# Altium integrated library vh_altium_library.intLib: 963 symbols (part 4 of 5) (continued)
## LT1721-SO (continued)

## LT1721-TSOP
designator U?
QUAD COMPARATOR TSOP16; Manufacturer Part Number: LT1721IGN; Manufacturer: Linear Technology; Output Type: CMOS, Rail-to-Rail, TTL; Description: IC COMP R-RINOUT QUAD 16-SSOP; Number of Elements: 4; Voltage - Supply: 2.7 V ~ 6 V; Supplier: Digi-Key; RoHS: RoHS non-compliant; Type: General Purpose; Package / Case: 16-SSOP; Category: Integrated Circuits (ICs); Supplier Part Number: LT1721IGN-ND; Packaging: Tube; Supplier 1: Digi-Key; Supplier Part Number 1: LT1721IGN-ND
footprint TSSOP16
pins: 1 -, 2 +, 3 GND, 4 a, 5 b, 6 GND, 7 +, 8 -, 9 -, 10 +, 11 VCC, 12 C, 13 D, 14 VCC, 15 +, 16 -

## LT1962EMS8-1.5
designator U?, comment LT1962-1V5
LDO 1.5V; Manufacturer Part Number: LT1962EMS8-1.5#PBF; Manufacturer: Linear Technology; Current - Limit (Min): 320mA; Number of Regulators: 1; Regulator Topology: Positive Fixed; Description: IC REG LDO 1.5V 300MA LN 8MSOP; Voltage - Input: 1.8 ~ 20 V; Voltage - Dropout (Typical): 0.27V @ 300mA; Current - Output: 300mA; Supplier 1: Digi-Key; Supplier Part Number 1: LT1962EMS8-1.5#PBF-ND; Supplier Part Number: LT1962EMS8-1.5#PBF-ND; Operating Temperature: -40°C ~ 125°C; Voltage - Output: 1.5V; Supplier: Digi-Key; Category: Integrated Circuits (ICs); RoHS: RoHS Compliant; Packaging: Tube; Package / Case: 8-MSOP, Micro8™, 8-uMAX, 8-uSOP,
footprint MSOP8
pins: 1 OUT, 2 SENSE, 3 BYP, 4 GND, 5 ~{SHDN}, 6 nc, 7 nc, 8 IN

## LT1962EMS8-1.8
designator U?, comment LT1962-1V8
LDO 1.8V; Manufacturer Part Number: LT1962EMS8-1.8; Manufacturer: Linear Technology; Current - Output: 300mA; Current - Limit (Min): 320mA; Voltage - Dropout (Typical): 0.27V @ 300mA; Description: IC REG LDO 1.8V 300MA LN 8MSOP; Number of Regulators: 1; Voltage - Input: Up to 20V; Regulator Topology: Positive Fixed; Supplier 1: Digi-Key; Supplier Part Number 1: LT1962EMS8-1.8-ND; Supplier Part Number: LT1962EMS8-1.8-ND; RoHS: RoHS non-compliant; Packaging: Tube; Category: Integrated Circuits (ICs); Voltage - Output: 1.8V; Package / Case: 8-MSOP, Micro8™, 8-uMAX, 8-uSOP,; Supplier: Digi-Key; Operating Temperature: -40°C ~ 125°C
footprint MSOP8
pins: 1 OUT, 2 SENSE, 3 BYP, 4 GND, 5 ~{SHDN}, 6 nc, 7 nc, 8 IN

## LT1962EMS8-2.5
designator U?, comment LT1962-2V5
LDO 2.5V; Manufacturer: Linear Technology; Manufacturer Part Number: LT1962EMS8-2.5#PBF; Current - Limit (Min): 320mA; Description: IC LDO REG LOWNOISE 2.5V 8-MSOP; Voltage - Input: Up to 20V; Regulator Topology: Positive Fixed; Voltage - Dropout (Typical): 0.27V @ 300mA; Current - Output: 300mA; Number of Regulators: 1; Supplier 1: Digi-Key; Supplier Part Number 1: LT1962EMS8-2.5#PBF-ND; Supplier Part Number: LT1962EMS8-2.5#PBF-ND; Operating Temperature: -40°C ~ 125°C; Package / Case: 8-MSOP, Micro8™, 8-uMAX, 8-uSOP,; Category: Integrated Circuits (ICs); Packaging: Tube; Voltage - Output: 2.5V; RoHS: RoHS Compliant; Supplier: Digi-Key
footprint MSOP8
pins: 1 OUT, 2 SENSE, 3 BYP, 4 GND, 5 ~{SHDN}, 6 nc, 7 nc, 8 IN

## LT1962EMS8-ADJ
designator U?, comment LT1962-ADJ
LDO ADJUSTABLE; Manufacturer Part Number: LT1962EMS8; Manufacturer: Linear Technology; Current - Limit (Min): 320mA; Voltage - Input: 1.8 ~ 20 V; Voltage - Dropout (Typical): 0.27V @ 300mA; Regulator Topology: Positive Adjustable; Number of Regulators: 1; Description: IC LDO REG LOWNOISE ADJ 8-MSOP; Current - Output: 300mA; Voltage - Output: 1.22 ~ 20 V; Supplier Part Number: LT1962EMS8-ND; Operating Temperature: -40°C ~ 125°C; Category: Integrated Circuits (ICs); Package / Case: 8-MSOP, Micro8™, 8-uMAX, 8-uSOP,; Packaging: Tube; RoHS: RoHS non-compliant; Supplier: Digi-Key; Supplier 1: Digi-Key; Supplier Part Number 1: LT1962EMS8-ND
footprint MSOP8
pins: 1 OUT, 2 ADJ, 3 BYP, 4 GND, 5 ~{SHDN}, 6 nc, 7 nc, 8 IN

## LT6100-MSOP
designator U?
CURRENT SENSE AMPLIFIER; Manufacturer Part Number: LT6100HMS8#PBF; Manufacturer: Linear Technology; Description: IC AMP CURRENT SENSE 8MSOP; Current - Supply: 60µA; Number of Circuits: 1; Voltage - Input Offset: 80µV; Slew Rate: 0.05 V/µs; Current - Output / Channel: 15mA; Voltage - Supply, Single/Dual (±): 2.7 V ~ 36 V, ±1.35 V ~ 18 V; NI?: *; O?: *; Section:: *; Supplier 1: Digi-Key; Supplier Part Number 1: LT6100HMS8#PBF-ND; Package / Case: 8-MSOP, Micro8™, 8-uMAX, 8-uSOP,; Supplier Part Number: LT6100HMS8#PBF-ND; Amplifier Type: Current Sense; Category: Integrated Circuits (ICs); Output Type: -; RoHS: RoHS Compliant; Packaging: Tube; Operating Temperature: -40°C ~ 125°C; Gain Bandwidth Product: -; Supplier: Digi-Key; Current - Input Bias: -
footprint MSOP8
pins: 1, 2, 3, 4, 5, 6, 7, 8

## LTC1442
designator U?
DUAL COMPARATOR WITH REFERENCE; Manufacturer Part Number: LTC1442CS8#PBF; Manufacturer: Linear Technology; Number of Elements: 2; Output Type: CMOS, TTL; Voltage - Supply: 2 V ~ 11 V, ±1 V ~ 5.5 V; Description: IC COMP W/REF LP DUAL 8-SOIC; Supplier 1: Digi-Key; Supplier Part Number 1: LTC1442CS8#PBF-ND; Supplier Part Number: LTC1442CS8#PBF-ND; Packaging: Tube; Category: Integrated Circuits (ICs); Type: with Voltage Reference; Supplier: Digi-Key; RoHS: RoHS Compliant; Package / Case: 8-SOIC (3.9mm Width)
footprint SO8
pins: 1, 2, 3, 4, 5, 6, 7, 8
text: V+; +; A; -; HYST; B; REF; V-

## LTC3404
designator U?
SYNCHRONOUS SWITCHER CONTROLLER; Supplier 1: Digi-Key; Supplier Part Number 1: LTC3404EMS8#PBF-ND
footprint MSOP8
pins: 1 RUN, 2 Ith, 3 Vfb, 4 GND, 5 SW, 6 Vin, 7 SYNC/MODE, 8 PLL LPF

## MAX232
designator U?
RS232 LEVEL SHIFTER; Manufacturer Part Number: MAX232DR; Manufacturer: Texas Instruments; Description: IC DUAL EIA-232 DRVR/RCVR 16SOIC; Number of Drivers/Receivers: 2/2; Voltage - Supply: 4.5 V ~ 5.5 V; Supplier 1: Digi-Key; Supplier Part Number 1: 296-14619-1-ND; RoHS: RoHS Compliant; Packaging: Cut Tape (CT); Protocol: RS232; Type: Transceiver; Supplier Part Number: 296-14619-1-ND; Supplier: Digi-Key; Category: Integrated Circuits (ICs); Package / Case: 16-SOIC (3.9mm Width)
footprint SO16
pins: 1 C1+, 2 V+, 3 C1-, 4 C2+, 5 C2-, 6 V-, 7 T2OUT, 8 R2IN, 9 R2OUT, 10 T2IN, 11 T1IN, 12 R1OUT, 13 R1IN, 14 T1OUT, 15 GND hidden to GND, 16 VCC hidden to VCC

## MAX708R
designator U?
RESET GENERATOR WITH POWER FAIL DETECTOR; Manufacturer: Maxim Integrated Products; Manufacturer Part Number: MAX708RCSA+; Output: Push-Pull, Push-Pull; Number of Voltages Monitored: 1; Reset: Active High/Active Low; Voltage - Threshold: 2.63V; Reset Timeout: 140 ms Minimum; Description: IC SUPERVISOR MPU 8-SOIC; Supplier 1: Digi-Key; Supplier Part Number 1: MAX708RCSA+-ND; Package / Case: 8-SOIC (3.9mm Width); Operating Temperature: 0°C ~ 70°C; RoHS: RoHS Compliant; Supplier Part Number: MAX708RCSA+-ND; Category: Integrated Circuits (ICs); Type: Simple Reset/Power-On Reset; Supplier: Digi-Key; Packaging: Tube
footprint SO8
pins: 1 ~{MR}, 2 VCC, 3 GND, 4 PFI, 5 ~{PFO}, 7 ~{RST}, 8 RST

## MAX1236
designator U?
4 CHANNEL 12 BIT A/D; Manufacturer: Maxim Integrated Products; Manufacturer Part Number: MAX1236LEUA+T; Voltage Supply Source: Single Supply; Sampling Rate (Per Second): 94.4k; Number of Bits: 12; Description: IC ADC 12BIT 4CH 2WIRE SER 8UMAX; Number of Converters: 1; Number of Inputs and Type: 4 Single-Ended, Unipolar; 4 Single-Ended, Bipolar; 2 Differential, Unipolar; 2 Differential, Bipolar; Power Dissipation (Max): 3.35mW; Data Interface: Serial; Supplier 1: Digi-Key; Supplier Part Number 1: MAX1236LEUA+T-ND; Supplier Part Number: MAX1236LEUA+T-ND; Operating Temperature: -40°C ~ 85°C; RoHS: RoHS Compliant; Package / Case: 8-MSOP, Micro8™, 8-uMAX, 8-uSOP,; Category: Integrated Circuits (ICs); Supplier: Digi-Key; Packaging: Tape & Reel (TR)
pins: 1 IN1, 2 IN2, 3 IN3, 4 IN4, 5 SCL, 6 SDA, 7 AGND, 8 VDD, 11 AS, 12 ~{CON}, 13 BUSY

## MAX1238
designator U?
12 CHANNEL 12 BIT A/D CONVERTOR; Manufacturer: Maxim Integrated Products; Manufacturer Part Number: MAX1238EEE+; Number of Inputs and Type: 12 Single-Ended, Unipolar; 12 Single-Ended, Bipolar; 6 Differential, Unipolar; 6 Differential, Bipolar; Number of Converters: 1; Description: IC ADC 12-BIT 94KSPS 16-QSOP; Data Interface: Serial; Power Dissipation (Max): 3.35mW; Voltage Supply Source: Single Supply; Sampling Rate (Per Second): 94.4k; Number of Bits: 12; Supplier 1: Digi-Key; Supplier Part Number 1: MAX1238EEE+-ND; Packaging: Tube; Supplier: Digi-Key; Supplier Part Number: MAX1238EEE+-ND; RoHS: RoHS Compliant; Category: Integrated Circuits (ICs); Package / Case: 16-QSOP; Operating Temperature: -40°C ~ 85°C
footprint tssop16
pins: 1 IN1, 2 IN2, 3 IN3, 4 IN4, 5 IN5, 6 IN6, 7 IN7, 8 IN8, 9 SCL, 10 SDA, 11 GND, 12 VDD, 13 IN12, 14 IN11, 15 IN10, 16 IN9

## MAX3370
designator U?
BIDIRECTIONAL LEVEL SHIFTER; Manufacturer Part Number: MAX3370EXK-T; Manufacturer: Maxim Integrated Products; Output Type: Logic; Data Rate: 2Mbps; Supply Voltage: 2.5 V ~ 5.5 V; Number of Channels: 1; Description: IC LEV XLTR LV 2MBPS 1UA SC70-5; Supplier 1: Digi-Key; Supplier Part Number 1: MAX3370EXK-T-ND; Supplier Part Number: MAX3370EXK-T-ND; Package / Case: SC-70-5, SC-88A, SOT-323-5, SOT-353, 5-TSSOP; Category: Integrated Circuits (ICs); Operating Temperature: -40°C ~ 85°C; Supplier: Digi-Key; Input Type: Logic; RoHS: RoHS non-compliant; Packaging: Tape & Reel (TR)
footprint SC70-5
pins: 1 VA, 2, 3, 4, 5 VB

## MAX3371
designator U?
BIDIRECTIONAL LEVEL SHIFTER; Manufacturer: Maxim Integrated Products; Manufacturer Part Number: MAX3371EXT+T; Description: IC LEVEL TRANSLATOR 2MBPS SC70-6; Output Type: Logic; Number of Channels: 1; Data Rate: 2Mbps; Supply Voltage: 2.5 V ~ 5.5 V; Supplier 1: Digi-Key; Supplier Part Number 1: MAX3371EXT+TTR-ND; Supplier Part Number: MAX3371EXT+TTR-ND; Category: Integrated Circuits (ICs); Package / Case: SC-70-6, SC-88, SOT-323-6, SOT-363; Supplier: Digi-Key; Operating Temperature: -40°C ~ 85°C; Packaging: Tape & Reel (TR); Input Type: Logic; RoHS: RoHS Compliant
footprint SC70-6
pins: 1 VA, 2, 3, 4, 5, 6 VB

## MAX4213
designator U?
Supplier 1: Digi-Key; Supplier Part Number 1: MAX4213ESA+-ND
footprint SO8
pins: 2 -, 3 +, 4, 6, 7, 8

## MAX4461
designator U?
INSTRUMENTATION AMPLIFIER; Manufacturer Part Number: MAX4461TESA+; Manufacturer: Maxim Integrated Products; Text Field1: ST; Text Field2: LM2903DT; Text Field3: Avnet; Text Field5: SO8; Text Field6: 0.078; Current - Supply: 800µA; Description: IC INSTR AMP SGL R-R 8-SOIC; Output Type: Rail-to-Rail; Gain Bandwidth Product: 2.5MHz; Voltage - Supply, Single/Dual (±): 2.85 V ~ 5.25 V; Current - Output / Channel: 150mA; Slew Rate: 0.5 V/µs; Current - Input Bias: 1pA; Voltage - Input Offset: 50µV; Number of Circuits: 1; Text Field4: LM2903DT; NI?: *; O?: *; Section:: *; Supplier 1: Digi-Key; Supplier Part Number 1: MAX4461TESA+-ND; Supplier: Digi-Key; Operating Temperature: -40°C ~ 85°C; Packaging: Tube; Amplifier Type: Instrumentation; Category: Integrated Circuits (ICs); Package / Case: 8-SOIC (3.9mm Width); Supplier Part Number: MAX4461TESA+-ND; RoHS: RoHS Compliant
footprint SO8
pins: 1, 2 GND, 3, 6, 7 +, 8 SHDN

## MAX6675
designator *
THERMOCOUPLE INTERFACE
pins: 1 GND, 2 T-, 3 T+, 4 VCC, 5  SCK, 6 ~{CS}, 7 SO

## MAX31855
designator U?
Supplier 1: Mouser; Supplier Part Number 1: 700-MAX31855KASA+
footprint SO8
pins: 1 GND, 2 T-, 3 T+, 4 VCC, 5  SCK, 6 ~{CS}, 7 SO

## MCP3001
designator U?
10 BIT A/D CONVERTOR; Manufacturer: Microchip Technology; Manufacturer Part Number: MCP3001-I/SN; Description: IC ADC 10BIT 2.7V 1CH SPI 8-SOIC; Number of Bits: 10; Sampling Rate (Per Second): 200k; Data Interface: Serial, SPI™; Number of Converters: 1; Voltage Supply Source: Single Supply; Number of Inputs and Type: 1 Pseudo-Differential, Unipolar; Supplier 1: Digi-Key; Supplier Part Number 1: MCP3001-I/SN-ND; Category: Integrated Circuits (ICs); Supplier Part Number: MCP3001-I/SN-ND; Supplier: Digi-Key; RoHS: RoHS Compliant; Power Dissipation (Max): -; Operating Temperature: -40°C ~ 85°C; Mounting Type: Surface Mount; Package / Case: 8-SOIC (3.9mm Width); Packaging: Tube; Supplier Device Package: *
footprint SO8
pins: 1 VREF, 2, 3, 4 VSS, 5 ~{CS}, 6 DO, 7 CLK, 8 VCC

## MCP3201
designator U?
12 BIT A/D CONVERTOR; Manufacturer Part Number: MCP3201-CI/SN; Manufacturer: Microchip Technology; Data Interface: Serial, SPI™; Number of Inputs and Type: 1 Single-Ended, Unipolar; Sampling Rate (Per Second): 100k; Number of Converters: 1; Number of Bits: 12; Voltage Supply Source: Single Supply; Description: IC ADC 12BIT SINGLE CHAN 8SOIC; Supplier 1: Digi-Key; Supplier Part Number 1: MCP3201-CI/SN-ND; RoHS: RoHS Compliant; Power Dissipation (Max): -; Mounting Type: Surface Mount; Supplier: Digi-Key; Operating Temperature: -40°C ~ 85°C; Category: Integrated Circuits (ICs); Supplier Part Number: MCP3201-CI/SN-ND; Supplier Device Package: *; Packaging: Tube; Package / Case: 8-SOIC (3.9mm Width)
footprint SO8
pins: 1 VREF, 2, 3, 4 VSS, 5 ~{CS}, 6 DO, 7 CLK, 8 VCC

## MCP3301
designator U?
13 BIT A/D CONVERTOR; Manufacturer Part Number: MCP3301-BI/SN; Manufacturer: Microchip Technology; Voltage Supply Source: Single Supply; Description: IC ADC 13BIT 2.7V SPI 8-SOIC; Number of Converters: 1; Data Interface: Serial, SPI™; Number of Bits: 13; Sampling Rate (Per Second): 100k; Supplier 1: Digi-Key; Supplier Part Number 1: MCP3301-BI/SN-ND; Supplier Part Number: MCP3301-BI/SN-ND; Supplier: Digi-Key; Number of Inputs and Type: *; Category: Integrated Circuits (ICs); Mounting Type: Surface Mount; Supplier Device Package: *; Packaging: Tube; RoHS: RoHS Compliant; Package / Case: 8-SOIC (3.9mm Width); Power Dissipation (Max): -; Operating Temperature: -40°C ~ 85°C
footprint SO8
pins: 1 VREF, 2, 3, 4 VSS, 5 ~{CS}, 6 DO, 7 CLK, 8 VCC

## MCP3550
designator U?
22 BIT A/D CONVERTOR; Manufacturer: Microchip Technology; Manufacturer Part Number: MCP3550-60E/SN; Voltage Supply Source: Single Supply; Number of Bits: 22; Sampling Rate (Per Second): 15; Number of Converters: 1; Data Interface: Serial, SPI™; Number of Inputs and Type: 1 Differential, Unipolar; Description: IC ADC 22BIT 2.7V 1CH 8SOIC; Supplier 1: Digi-Key; Supplier Part Number 1: MCP3550-60E/SN-ND; Power Dissipation (Max): -; Supplier Part Number: MCP3550-60E/SN-ND; Packaging: Tube; Supplier Device Package: *; Supplier: Digi-Key; Operating Temperature: -40°C ~ 125°C; Package / Case: 8-SOIC (3.9mm Width); Mounting Type: Surface Mount; RoHS: RoHS Compliant
footprint SO8
pins: 1 VREF, 2, 3, 4 VSS, 5 CLK, 6 DO, 7 ~{CS}, 8 VCC

## NE555
designator U?
TIMER IC; Manufacturer Part Number: NE555DT; Manufacturer: STMicroelectronics; Frequency: 500kHz; Voltage - Supply: 4.5 V ~ 16 V; Current: 200mA; Description: IC TIMER SINGLE BIPOLAR 8 SOIC; Supplier 1: Digi-Key; Supplier Part Number 1: 497-1962-2-ND; Supplier: Digi-Key; Category: Integrated Circuits (ICs); Supplier Part Number: 497-1962-2-ND; Package / Case: 8-SOIC (3.9mm Width); Packaging: Tape & Reel (TR); RoHS: RoHS Compliant; Operating Temperature: 0°C ~ 70°C; Count: -; Type: 555 Type, Timer/Oscillator (Single)
footprint SO8
pins: 1 GND, 2 TRIG, 3 OUT, 4 RST, 5 C, 6 TH, 7 DIS, 8 VCC

## OP2177
designator U?
PRECISION OPAMP 1.3 MHz; Manufacturer: Analog Devices Inc; Manufacturer Part Number: OP2177ARZ-REEL; Slew Rate: 0.7 V/µs; Description: IC OPAMP GP 1.3MHZ DUAL LN 8SOIC; Current - Supply: 400µA; Amplifier Type: General Purpose; Number of Circuits: 2; Current - Input Bias: 500pA; Voltage - Input Offset: 15µV; Gain Bandwidth Product: 1.3MHz; Current - Output / Channel: 10mA; Voltage - Supply, Single/Dual (±): 5 V ~ 36 V, ±2.5 V ~ 18 V; Supplier 1: Digi-Key; Supplier Part Number 1: OP2177ARZ-REEL-ND; Supplier: Digi-Key; RoHS: RoHS Compliant; Packaging: Tape & Reel (TR); Category: Integrated Circuits (ICs); Operating Temperature: -40°C ~ 125°C; Package / Case: 8-SOIC (3.9mm Width); Output Type: -; Supplier Part Number: OP2177ARZ-REEL-ND
footprint so8
part A pins: 5 (in), 6 (in), 7 OUT (out), 8 (power)
part B pins: 1 1 OUT (out), 2 1 IN- (in), 3 1 IN+ (in), 4 (power)

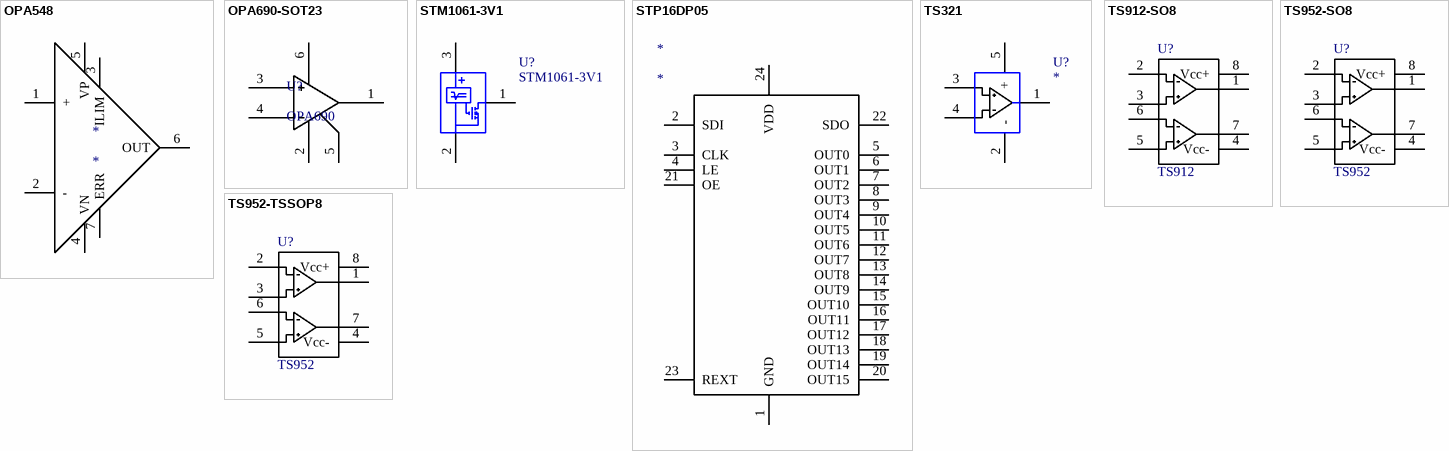
[diagram p43: symbols OPA548 to TS952-TSSOP8]

## OPA548
designator *
pins: 1 +, 2 -, 3 ILIM, 4 VN, 5 VP, 6 OUT, 7 ERR

## OPA690-SOT23
designator U?, comment OPA690
Supplier 1: Digi-Key; Supplier Part Number 1: OPA690IDBVRG4-ND
footprint SOT23-6
pins: 1, 2, 3 -, 4 +, 5, 6

## STM1061-3V1
designator U?
VOLTAGE DETECTOR 3.1V; Manufacturer: STMicroelectronics; Manufacturer Part Number: STM1061N31WX6F; Reset Timeout: 30 µs Typical Propagation Delay; Number of Voltages Monitored: 1; Output: Open Drain or Open Collector; Reset: Active Low; Description: IC VOLT DETECTOR 3.1V LP SOT-23; Supplier 1: Digi-Key; Supplier Part Number 1: 497-4957-1-ND; Voltage - Threshold: 3.1V; RoHS: RoHS Compliant; Supplier Part Number: 497-4957-1-ND; Operating Temperature: -40°C ~ 85°C; Type: Simple Reset/Power-On Reset; Category: Integrated Circuits (ICs); Packaging: Cut Tape (CT); Package / Case: SOT-23-3; Supplier: Digi-Key
footprint sot23-123
pins: 1 OUT, 2 GND, 3 VCC

## STP16DP05
designator *
pins: 1 GND, 2 SDI, 3 CLK, 4 LE, 5 OUT0, 6 OUT1, 7 OUT2, 8 OUT3, 9 OUT4, 10 OUT5, 11 OUT6, 12 OUT7, 13 OUT8, 14 OUT9, 15 OUT10, 16 OUT11, 17 OUT12, 18 OUT13, 19 OUT14, 20 OUT15, 21 OE, 22 SDO, 23 REXT, 24 VDD

## TS321
designator U?
LOW POWER OPAMP SOT23; Manufacturer Part Number: TS321ILT; Manufacturer: STMicroelectronics; Description: IC OPAMP SGL BIPOLAR LP SOT23-5; Gain Bandwidth Product: 800kHz; Current - Supply: 600µA; Current - Output / Channel: 40mA; Number of Circuits: 1; Current - Input Bias: 20nA; Voltage - Supply, Single/Dual (±): 3 V ~ 30 V, ±1.5 V ~ 15 V; Voltage - Input Offset: 500µV; Amplifier Type: General Purpose; Slew Rate: 0.4 V/µs; Supplier 1: Digi-Key; Supplier Part Number 1: 497-4061-1-ND; Operating Temperature: -40°C ~ 125°C; RoHS: RoHS Compliant; Category: Integrated Circuits (ICs); Package / Case: SOT-23-5, SC-74A, SOT-25; Supplier Part Number: 497-4061-1-ND; Packaging: Cut Tape (CT); Supplier: Digi-Key; Output Type: -
footprint SOT23-5
pins: 1, 2 -, 3, 4, 5 +

## TS912-SO8
designator U?, comment TS912
DUAL RAIL TO RAIL OPAMP; Manufacturer Part Number: TS921ID; Manufacturer: STMicroelectronics; Number of Circuits: 1; Slew Rate: 1.3 V/µs; Current - Output / Channel: 80mA; Voltage - Supply, Single/Dual (±): 2.7 V ~ 12 V; Output Type: Rail-to-Rail; Current - Input Bias: 15nA; Gain Bandwidth Product: 4MHz; Amplifier Type: General Purpose; Voltage - Input Offset: 3000µV; Description: IC OP AMP R-R SINGLE 8-SOIC; Current - Supply: 1mA; NI?: *; O?: *; Section:: *; Supplier 1: Digi-Key; Supplier Part Number 1: TS921ID-ND; Category: Integrated Circuits (ICs); Supplier Part Number: TS921ID-ND; Packaging: Tube; RoHS: RoHS Compliant; Operating Temperature: -40°C ~ 125°C; Supplier: Digi-Key; Package / Case: 8-SOIC (3.9mm Width)
footprint SO8
pins: 1, 2, 3, 4 Vcc-, 5, 6, 7, 8 Vcc+

## TS952-SO8
designator U?, comment TS952
DUAL RAIL TO RAIL OPAMP; Manufacturer Part Number: TS952IYDT; Manufacturer: STMicroelectronics; Gain Bandwidth Product: 3MHz; Current - Supply: 950µA; Output Type: Rail-to-Rail; Description: IC OP AMP RRIO LOW PWR 8-SOIC; Current - Input Bias: 35nA; Amplifier Type: General Purpose; Voltage - Supply, Single/Dual (±): 2.7 V ~ 12 V; Slew Rate: 1 V/µs; Voltage - Input Offset: 6000µV; Current - Output / Channel: 10mA; Number of Circuits: 2; NI?: *; O?: *; Section:: *; Supplier 1: Digi-Key; Supplier Part Number 1: 497-4777-6-ND; Operating Temperature: -40°C ~ 125°C; Package / Case: 8-SOIC (3.9mm Width); Supplier: Digi-Key; Category: Integrated Circuits (ICs); Packaging: Digi-Reel®; Supplier Part Number: 497-4777-6-ND; RoHS: RoHS Compliant
footprint SO8
pins: 1, 2, 3, 4 Vcc-, 5, 6, 7, 8 Vcc+

## TS952-TSSOP8
designator U?, comment TS952
DUAL RAIL TO RAIL OPAMP; Manufacturer Part Number: TS952IYPT; Manufacturer: STMicroelectronics; Description: IC OP AMP RRIO LOW PWR 8-TSSOP; Supplier 1: Digi-Key; Supplier Part Number 1: 497-10266-2-ND
footprint TSSOP8
pins: 1, 2, 3, 4 Vcc-, 5, 6, 7, 8 Vcc+


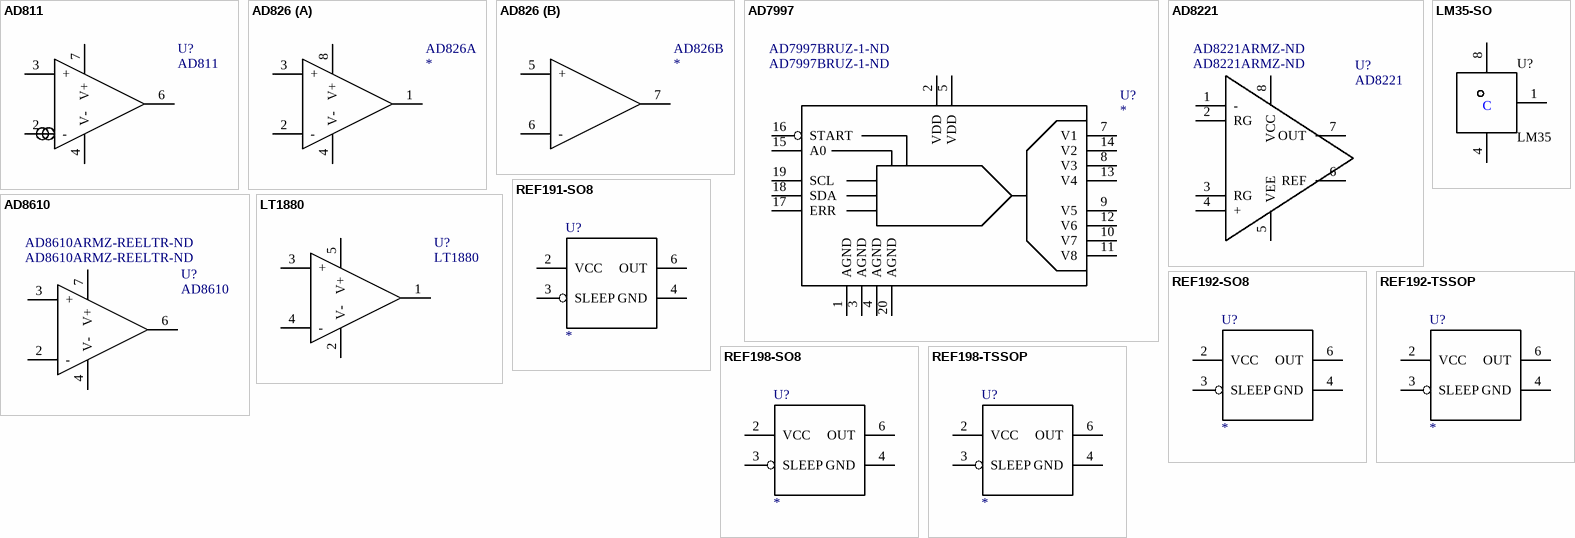
[diagram p44: symbols AD811 to REF198-TSSOP]

## AD811
designator U?
footprint SO8
pins: 2 -, 3 +, 4 V-, 6 OUT, 7 V+

## AD826
designator AD826
AD826; Manufacturer: Analog Devices Inc; Manufacturer Part Number: AD826ARZ; Current - Input Bias: 3.3µA; Current - Output / Channel: 50mA; Slew Rate: 350 V/µs; Number of Circuits: 2; Description: IC OPAMP VF 50MHZ DUAL LP 8SOIC; Current - Supply: 6.6mA; Voltage - Supply, Single/Dual (±): 5 V ~ 36 V, ±2.5 V ~ 18 V; Voltage - Input Offset: 500µV; Gain Bandwidth Product: 50MHz; Amplifier Type: Voltage Feedback; Supplier 1: Digi-Key; Supplier: Digi-Key; Package / Case: 8-SOIC (3.9mm Width); Operating Temperature: -40°C ~ 85°C; Category: Integrated Circuits (ICs); Packaging: Tube; RoHS: RoHS Compliant; Output Type: -; Supplier Part Number 1: AD826ARZ-ND; Supplier Part Number: AD826ARZ-ND
footprint SO8
part A pins: 1 OUT, 2 -, 3 +, 4 V-, 8 V+
part B pins: 5 +, 6 -, 7 OUT

## AD7997
designator U?  Supplier Part Number 1: AD7997BRUZ-1-ND
AD7997; Manufacturer Part Number: AD7997BRUZ-1; Manufacturer: Analog Devices Inc; Number of Bits: 10; Data Interface: I²C; Power Dissipation (Max): 2.2mW; Voltage Supply Source: Single Supply; Sampling Rate (Per Second): 188k; Number of Converters: 1; Description: IC ADC 10BIT 8CHAN I2C 20TSSOP; Number of Inputs and Type: 8 Single-Ended, Unipolar; Supplier 1: Digi-Key; Package / Case: 20-TSSOP; RoHS: RoHS Compliant; Packaging: Tube; Operating Temperature: -40°C ~ 85°C; Category: Integrated Circuits (ICs); Supplier: Digi-Key; Supplier Part Number: AD7997BRUZ-1-ND
pins: 1 AGND, 2 VDD, 3 AGND, 4 AGND, 5 VDD, 7  V1, 8 V3, 9 V5, 10 V7, 11 V8, 12 V6, 13 V4, 14 V2, 15 A0, 16 START, 17 ERR, 18 SDA, 19 SCL, 20 AGND

## AD8221
designator U?  Supplier Part Number 1: AD8221ARMZ-ND
Manufacturer: Analog Devices Inc; Manufacturer Part Number: AD8221ARMZ; Number of Circuits: 1; Current - Output / Channel: 18mA; Description: IC AMP INST PREC LN 18MA 8MSOP; Voltage - Supply, Single/Dual (±): ±2.3 V ~ 18 V; Slew Rate: 2 V/µs; Current - Input Bias: 500pA; Amplifier Type: Instrumentation; Voltage - Input Offset: 60µV; Current - Supply: 900µA; Supplier 1: Digi-Key; Packaging: Tube; Package / Case: 8-MSOP, Micro8™, 8-uMAX, 8-uSOP,; Supplier: Digi-Key; Category: Integrated Circuits (ICs); Output Type: -; Operating Temperature: -40°C ~ 85°C; Gain Bandwidth Product: -; RoHS: RoHS Compliant; Supplier Part Number: AD8221ARMZ-ND
footprint MSOP8
pins: 1 -, 2 RG, 3 RG, 4 +, 5 VEE, 6 REF, 7 OUT, 8 VCC

## AD8610
designator U?  Supplier Part Number 1: AD8610ARMZ-REELTR-ND
Manufacturer: Analog Devices Inc; Manufacturer Part Number: AD8610ARMZ-REEL; Description: IC OPAMP JFET 25MHZ PREC 8MSOP; Slew Rate: 60 V/µs; Number of Circuits: 1; Voltage - Input Offset: 85µV; Current - Output / Channel: 45mA; Current - Supply: 3mA; Voltage - Supply, Single/Dual (±): ±5 V ~ 13 V; Amplifier Type: J-FET; Gain Bandwidth Product: 25MHz; Current - Input Bias: 3pA; Supplier 1: Digi-Key; Category: Integrated Circuits (ICs); Operating Temperature: -40°C ~ 125°C; Packaging: Tape & Reel (TR); Package / Case: 8-MSOP, Micro8™, 8-uMAX, 8-uSOP,; RoHS: RoHS Compliant; Supplier: Digi-Key; Output Type: -; Supplier Part Number: AD8610ARMZ-REELTR-ND
footprint MSOP8
pins: 2 -, 3 +, 4 V-, 6 OUT, 7 V+

## LM35-SO
designator U?, comment LM35
LM35 TEMPERATURE SENSOR; Part Field 1: Centigrade Temperature Sensor LM35 SO8; Part Field 2: Digikey; Part Field 3: LM35DM-ND; Part Field 4: NATIONAL SEMICONDUCTOR
footprint SO8
pins: 1 OUT, 4 GND, 8 V+
text: C

## LT1880
designator U?
Manufacturer: Linear Technology; Manufacturer Part Number: LT1880CS5#TRMPBF; Current - Output / Channel: 25mA; Slew Rate: 0.55 V/µs; Current - Input Bias: 150pA; Number of Circuits: 1; Voltage - Supply, Single/Dual (±): 2.7 V ~ 36 V, ±1.35 V ~ 18 V; Voltage - Input Offset: 40µV; Amplifier Type: General Purpose; Description: IC OPAMP PICO/IN RR/OUT TSOT23-5; Gain Bandwidth Product: 1.1MHz; Current - Supply: 1.5mA; Output Type: Rail-to-Rail; Supplier 1: Digi-Key; RoHS: RoHS Compliant; Operating Temperature: 0°C ~ 70°C; Category: Integrated Circuits (ICs); Supplier: Digi-Key; Package / Case: TSOT-23-5, TSOT-5, TSOP-5; Packaging: Tape & Reel (TR); Supplier Part Number 1: LT1880CS5#TRMPBFTR-ND; Supplier Part Number: LT1880CS5#TRMPBFTR-ND
footprint SOT23-5
pins: 1 OUT, 2 V-, 3 +, 4 -, 5 V+

## REF191-SO8
designator U?
REFERENCE DIODE 2.048 VOLT; Manufacturer: Analog Devices Inc; Manufacturer Part Number: REF191GSZ; Tolerance: ±10mV; Number of Channels: 1; Voltage - Output: 2.048V; Voltage - Input: 3 ~ 15 V; Current - Output: 30mA; Current - Quiescent: 45µA; Description: IC VOLT REF LDO 2.048V 8SOIC; Temperature Coefficient: 25ppm/°C; Reference Type: Series; Category: Integrated Circuits (ICs); Current - Cathode: -; Package / Case: 8-SOIC (3.9mm Width); Operating Temperature: -40°C ~ 85°C; Supplier: Digi-Key; Packaging: Tube; RoHS: RoHS Compliant; Supplier 1: Digi-Key; Supplier Part Number: REF191GSZ-ND; Supplier Part Number 1: REF191GSZ-ND
footprint SO8
pins: 2 VCC, 3 SLEEP, 4 GND, 6 OUT

## REF192-SO8
designator U?
REFERENCE DIODE 2.5 VOLT; Manufacturer: Analog Devices Inc; Manufacturer Part Number: REF192GSZ; Tolerance: ±10mV; Number of Channels: 1; Voltage - Output: 2.5V; Voltage - Input: 3 ~ 15 V; Current - Output: 30mA; Current - Quiescent: 45µA; Description: IC VOLT REFERENCE LDO 2.5V 8SOIC; Temperature Coefficient: 25ppm/°C; Reference Type: Series; Supplier 1: Digi-Key; Category: Integrated Circuits (ICs); Current - Cathode: -; Package / Case: 8-SOIC (3.9mm Width); Operating Temperature: -40°C ~ 85°C; Supplier: Digi-Key; Packaging: Tube; RoHS: RoHS Compliant; Supplier Part Number 1: REF192GSZ-ND; Supplier Part Number: REF192GSZ-ND
footprint SO8
pins: 2 VCC, 3 SLEEP, 4 GND, 6 OUT

## REF192-TSSOP
designator U?
REFERENCE DIODE 2.5 VOLT; Manufacturer: Analog Devices Inc; Manufacturer Part Number: REF192GRUZ; Tolerance: ±10mV; Number of Channels: 1; Voltage - Output: 2.5V; Voltage - Input: 3 ~ 15 V; Current - Output: 30mA; Current - Quiescent: 45µA; Description: IC VOLT REF MCRPWR 2.5V 8-TSSOP; Temperature Coefficient: 25ppm/°C; Reference Type: Series; Category: Integrated Circuits (ICs); Current - Cathode: -; Package / Case: 8-TSSOP; Operating Temperature: -40°C ~ 85°C; Supplier: Digi-Key; Packaging: Tube; RoHS: RoHS Compliant; Supplier 1: Digi-Key; Supplier Part Number: REF192GRUZ-ND; Supplier Part Number 1: REF192GRUZ-ND
footprint TSSOP8
pins: 2 VCC, 3 SLEEP, 4 GND, 6 OUT

## REF198-SO8
designator U?
REFERENCE DIODE 4.096 VOLT; Manufacturer: Analog Devices Inc; Manufacturer Part Number: REF192GSZ; Tolerance: ±10mV; Number of Channels: 1; Voltage - Output: 2.5V; Voltage - Input: 3 ~ 15 V; Current - Output: 30mA; Current - Quiescent: 45µA; Description: IC VOLT REFERENCE LDO 2.5V 8SOIC; Temperature Coefficient: 25ppm/°C; Reference Type: Series; Supplier 1: Digi-Key; Category: Integrated Circuits (ICs); Current - Cathode: -; Package / Case: 8-SOIC (3.9mm Width); Operating Temperature: -40°C ~ 85°C; Supplier: Digi-Key; Packaging: Tube; RoHS: RoHS Compliant; Supplier Part Number 1: REF192GSZ-ND; Supplier Part Number: REF192GSZ-ND
footprint SO8
pins: 2 VCC, 3 SLEEP, 4 GND, 6 OUT

## REF198-TSSOP
designator U?